# Altium schematic symbol library Hydra_Ref_sch.SCHLIB: 791 symbols (part 3 of 5) (continued)
## MRSS-12208 (continued)
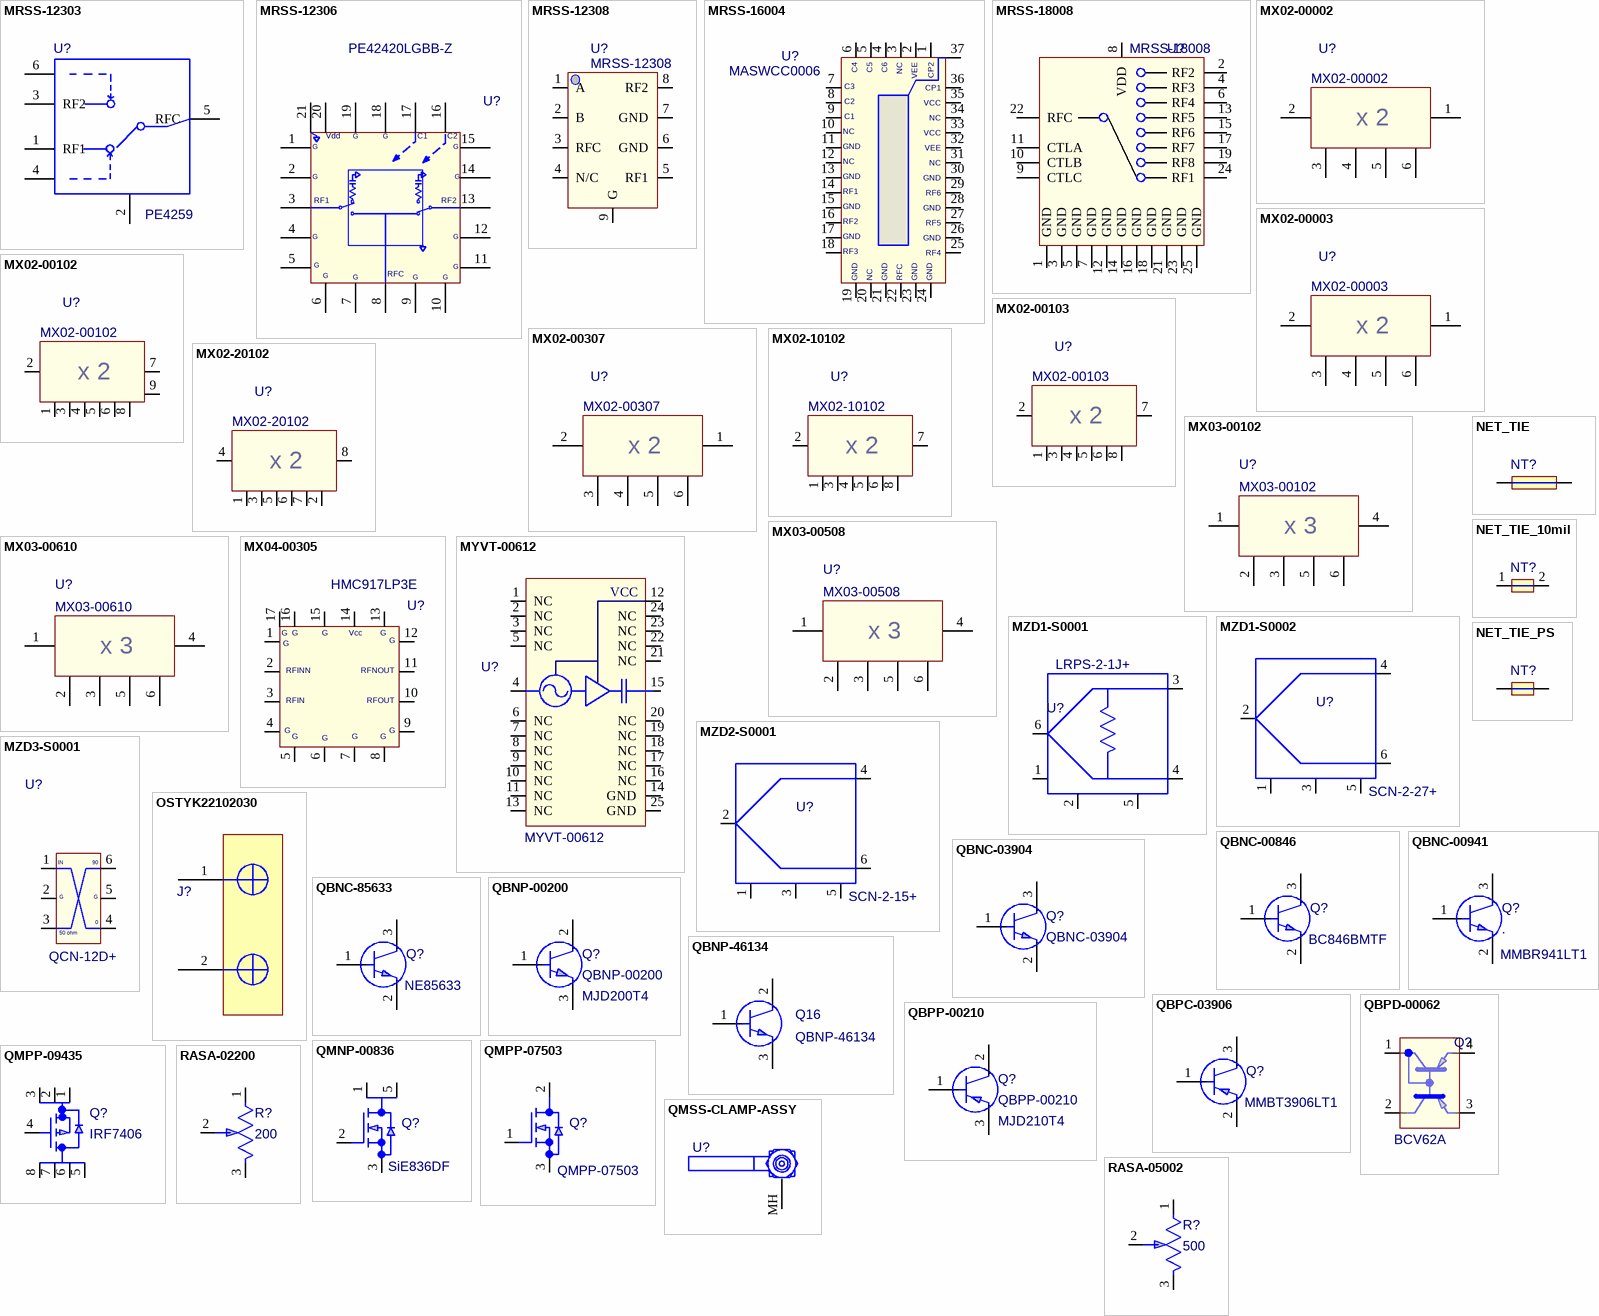
[diagram p11: symbols MRSS-12303 to RASA-05002]

## MRSS-12303
designator U?, comment M_PN: PE4259  (hidden comment: SWITCH;SPDT;3GHz;27DB ISO;50DBM;+BIAS;S8)
Value: PE4259; G_PN: MRSS-12303; NoLoad: .; Approved: CL; MFGR: PEREGRINE SEMICONDUCTOR; level: 1; ModifyDate: 3/19/12; item_number: MRSS-12303
footprint SO6-SC-70 (PACKAGE type SC-70)
pins: 1 RF1, 2 GND, 3 RF2, 4 CTRL, 5 RFC, 6 CTRL*_VDD

## MRSS-12306
designator U?, comment M_PN: PE42420LGBB-Z  (hidden comment: SSWITCH;SPDT;DC-6GHz;60DB ISO;30;4DBM;2.5-3.3V CTRL;QFN-20)
MFGR: PEREGRINE; Approved: CL; G_PN: MRSS-12306; Value: PE42420LGBB-Z; NoLoad: .; level: 1; ModifyDate: 9/24/14; item_number: MRSS-12306
footprint QFN-20_PEREGRINE (Footprint not found)
pins: 1 GND, 2 GND, 3 RF1, 4 GND, 5 GND, 6 GND, 7 GND, 8 NC, 9 GND, 10 GND, 11 GND, 12 GND, 13 RF2, 14 GND, 15 GND, 16 C2, 17 C1, 18 GND, 19 GND, 20 Vdd, 21 GND
text: G; RFC

## MRSS-12308
designator U?, comment G_PN: MRSS-12308  (hidden comment: SPDT SWITCH,DC-8.0 GHz,GaAs,IL .8 dB, SMT MSOP-8)
Value: HMC270MS8GE; MFGR: HITTITE; NoLoad: .; Approved: CL; level: 1; ModifyDate: 6/1/13; M_PN: HMC270MS8GE; item_number: MRSS-12308
footprint MS8GE (RoHS Mold Compound 192X118X43(mil))
pins: 1 A, 2 B, 3 RFC, 4 N/C, 5 RF1, 6 GND, 7 GND, 8 RF2, 9 G

## MRSS-16004
designator U?, comment M_PN: MASWCC0006  (hidden comment: SWITCH;SP6T;DC-4GHZ;25DB ISO;20NS;27DBM P1;PQFN-36)
MFGR: HITTITE; Approved: CL; G_PN: MRSS-16004; Value: MASWCC0006; NoLoad: .; level: 1; ModifyDate: 4/8/13; item_number: MRSS-16004
footprint QFN36_MACOM (CSP-2, LEAD-FREE 4 X 7 MM, 36-LEAD PQFN)
pins: 1 CP2, 2 VEE, 3 NC, 4 C6, 5 C5, 6 C4, 7 C3, 8 C2, 9 C1, 10 NC, 11 GND, 12 NC, 13 GND, 14 RF1, 15 GND, 16 RF2, 17 GND, 18 RF3, 19 GND, 20 NC, 21 GND, 22 RFC, 23 GND, 24 GND, 25 RF4, 26 GND, 27 RF5, 28 GND, 29 RF6, 30 GND, 31 NC, 32 VEE, 33 VCC, 34 NC, 35 VCC, 36 CP1, 37 GND

## MRSS-18008
designator U?, comment G_PN: MRSS-18008  (hidden comment: SWITCH;SP8T;8GHZ;POS CTRL;30DB ISO;19DBM;QFN-24)
MFGR: Hittite; NoLoad: .; Approved: NM; M_PN: HMC321LP4; level: 1; Value: *; ModifyDate: 11/14/12; item_number: MRSS-18008
footprint QFN50p400x400x100-25N
pins: 1 GND, 2 RF2, 3 GND, 4 RF3, 5 GND, 6 RF4, 7 GND, 8 VDD, 9 CTLC, 10 CTLB, 11 CTLA, 12 GND, 13 RF5, 14 GND, 15 RF6, 16 GND, 17 RF7, 18 GND, 19 RF8, 21 GND, 22 RFC, 23 GND, 24 RF1, 25 GND

## MX02-00002
designator U?, comment G_PN: MX02-00002  (hidden comment: DOUBLER;10-1000 MHZ IN;10.5DB CONV LOSS;12-16DBM IN;TTT167 CASE)
NoLoad: .; Approved: CL; MFGR: MINI-CIRCUITS; Value: SYK-2R+; level: 1; ModifyDate: 5/18/12; M_PN: SYK-2R+; item_number: MX02-00002
footprint SYK-2R (x2 Multiplier)
footprint SYK-2R 3-GND PINS (CASE STYLE TTT167)
pins: 1, 2, 3, 4, 5, 6
text: x 2

## MX02-00003
designator U?, comment G_PN: MX02-00003  (hidden comment: DOUBLER;100-3000 MHZ IN;11.5DB CONV LOSS;11-15DBM IN;TTT167 CASE)
NoLoad: .; Approved: CL; MFGR: MINI-CIRCUITS; Value: SYK-2-33+; level: 1; ModifyDate: 3/1/13; M_PN: SYK-2-33+; item_number: MX02-00003
footprint TTT167 (Footprint not found)
footprint SYK-2R 3-GND PINS (CASE STYLE TTT167)
pins: 1, 2, 3, 4, 5, 6
text: x 2

## MX02-00102
designator U?, comment G_PN: MX02-00102  (hidden comment: DOUBLER;700-2400 MHZ IN;15DB CONV LOSS;10-20DBM IN;SO-8)
NoLoad: .; Approved: CL; MFGR: HITTITE; Value: HMC156AC8; level: 1; ModifyDate: 3/11/13; M_PN: HMC156AC8; item_number: MX02-00102
footprint SO-8_Hittite (Hittite C8, 8 LEAD CERAMIC/METAL, Body 5.59x4.32mm, Pitch 1.27mm, Thermal Pad 4.83.2x3.81.2mm)
footprint SYK-2R 3-GND PINS (CASE STYLE TTT167)
pins: 1 NC, 2 IN, 3 G, 4 NC, 5 NC, 6 G, 7 OUT, 8 NC, 9 NC
text: x 2

## MX02-00103
designator U?, comment G_PN: MX02-00103  (hidden comment: DOUBLER;1250 3000 MHZ IN;15DB CONV LOSS;10-20DBM IN;MS8)
NoLoad: .; Approved: CL; MFGR: HITTITE; Value: HMC188MS8E; level: 1; ModifyDate: 3/11/13; M_PN: HMC188MS8E; item_number: MX02-00103
footprint MS8_Hittite (SOP, 8-Leads, Body 3.1x3.1mm, Pitch 0.65mm, IPC High Density)
footprint SYK-2R 3-GND PINS (CASE STYLE TTT167)
pins: 1 NC, 2 IN, 3 G, 4 NC, 5 NC, 6 G, 7 OUT, 8 NC
text: x 2

## MX02-00307
designator U?, comment G_PN: MX02-00307  (hidden comment: DOUBLER;3.4-7.2 GHZ IN;11DB CONV LOSS;8-13 DBM IN;DZ885 CASE)
NoLoad: .; Approved: CL; MFGR: MINI-CIRCUITS; Value: KC2-36+; level: 1; ModifyDate: 3/6/13; M_PN: KC2-36+; item_number: MX02-00307
footprint DZ885 (Footprint not found)
footprint SYK-2R 3-GND PINS (CASE STYLE TTT167)
pins: 1, 2, 3, 4, 5, 6
text: x 2

## MX02-10102
designator U?, comment G_PN: MX02-10102  (hidden comment: DOUBLER;850-2000 MHZ IN;15DB CONV LOSS;10-20DBM IN;SO-8)
NoLoad: .; Approved: CL; MFGR: HITTITE; Value: HMC187AMS8; level: 1; ModifyDate: 3/11/13; M_PN: HMC187AMS8; item_number: MX02-10102
footprint SO-8_Hittite (Footprint not found)
footprint SYK-2R 3-GND PINS (CASE STYLE TTT167)
pins: 1 NC, 2 IN, 3 G, 4 NC, 5 NC, 6 G, 7 OUT, 8 NC
text: x 2

## MX02-20102
designator U?, comment G_PN: MX02-20102  (hidden comment: DOUBLER;850-2000 MHZ IN;15DB CONV LOSS;10-20DBM IN;SO-8)
NoLoad: .; Approved: CL; MFGR: MINI-CIRCUITS; Value: KSX2-442+; level: 1; ModifyDate: 5/14/13; M_PN: KSX2-442+; item_number: MX02-20102
footprint HV1195 (OLD PART SIM-4432H+)
footprint SYK-2R 3-GND PINS (CASE STYLE TTT167)
pins: 1 GND, 2 TERM, 3 GND, 4 IN, 5 GND, 6 GND, 7 GND, 8 OUT
text: x 2

## MX03-00102
designator U?, comment G_PN: MX03-00102  (hidden comment: FFREQ MULTIPLIER X3;OUTPUT 1.2-2.1 GHz;12-17 dBm INPUT;SMT .25X.31X.16;CASE TT1224)
NoLoad: .; Approved: CL; MFGR: MINI-CIRCUITS; Value: RMK-3-212+; level: 1; ModifyDate: 8/2/16; M_PN: RMK-3-212+; item_number: MX03-00102
footprint TT1224 (.250x.160x.160" 6pin Frequency Multiplier - Mini-Circuit)
pins: 1, 2, 3, 4, 5, 6
text: x 3

## MX03-00508
designator U?, comment G_PN: MX03-00508  (hidden comment: FREQ MULTIPLIER X3;OUTPUT 5.4-8.1 GHz;0-6 dBm INPUT;  SMT .25X.31X.16;CASE TT1224)
NoLoad: .; Approved: NM; MFGR: MINI-CIRCUITS; Value: RMK-3-812+; level: 1; ModifyDate: 12/05/12; M_PN: RMK-3-812+; item_number: MX03-00508
footprint TT1224 (.250x.160x.160" 6pin Frequency Multiplier - Mini-Circuit)
pins: 1, 2, 3, 4, 5, 6
text: x 3

## MX03-00610
designator U?, comment G_PN: MX03-00610  (hidden comment: FREQ MULTIPLIER X3;OTPUT 6.6-10 GHz;13-17 dBm INPUT;SMT .25X.31X.16;CASE TT1224)
NoLoad: .; Approved: CL; MFGR: MINI-CIRCUITS; Value: RMK-3-14+; level: 1; ModifyDate: 3/12/13; M_PN: RMK-3-14+; item_number: MX03-00610
footprint TT1224 (.250x.160x.160" 6pin Frequency Multiplier - Mini-Circuit)
pins: 1, 2, 3, 4, 5, 6
text: x 3

## MX04-00305
designator U?, comment M_PN: HMC917LP3E  (hidden comment: QUADRUPLER;1500-2500 MHZ IN;5DB CONV LOSS;0-10DBM IN;LP3E)
MFGR: HITTITE; Approved: CL; G_PN: MX04-00305; Value: HMC917LP3E; NoLoad: .; level: 1; ModifyDate: 11.22/13; item_number: MX04-00305
footprint QFN-16_HITTITE_LP3 (QFN-16 HITTITE)
pins: 1 Vdd, 2 Vctl, 3 RFC, 4 NC, 5 EN, 6 NC, 7 NC, 8 NC, 9 RF1, 10 GND, 11 GND, 12 RF2, 13 NC, 14 NC, 15 NC, 16 NC, 17 GND
text: G; Vcc; RFINN; RFNOUT; RFIN; RFOUT

## MYVT-00612
designator U?, comment G_PN: MYVT-00612  (hidden comment: OSCILLATOR;VCO;MMIC;6-12GHz,+1dBm OUT;5V SUP;0-23V TUNE;4X4mm LC-24 W/BOT PAD)
MFGR: Hittite; NoLoad: .; Approved: NM; M_PN: HMC732LC4B; level: 1; Value: *; ModifyDate: 10/27/12; item_number: MYVT-00612
footprint QFN-24_HITTITE_LC4B_047 (LC4B – 4 x 4 mm QFN CERAMIC  HIGH FREQUENCY SMT PACKAGE, 47mil height)
pins: 1 NC, 2 NC, 3 NC, 4 GND, 5 NC, 6 NC, 7 NC, 8 NC, 9 NC, 10 NC, 11 NC, 12 VCC, 13 NC, 14 GND, 15 RFOUT, 16 NC, 17 NC, 18 NC, 19 NC, 20 NC, 21 NC, 22 NC, 23 NC, 24 NC, 25 GND

## MZD1-S0001
designator U?, comment LRPS-2-1J+
POWER DIVIDER;5-500MHZ;0DEG;.39X.31X.225; G_PN: MZD1-S0001; Approved: CL; NoLoad: .; MFGR: MINI-CIRCUITS; level: 1; Value: LRPS-2-1J+; ModifyDate: 02/22/12; M_PN: LRPS-2-1J+; item_number: MZD1-S0001
footprint SO6-QQQ569 (CASE STYLE QQQ569 -Mini-Circuit)
pins: 1, 2, 3, 4, 5, 6

## MZD1-S0002
designator U?, comment M_PN: SCN-2-27+  (hidden comment: LRPS-2-1J+)
POWER SPLITTER/COMBINER;2225-2700 MHZ;0 DEG;FV1206-1 CASE; Value: SCN-2-27+; Approved: CL; NoLoad: .; G_PN: MZD1-S0002; MFGR: MINI-CIRCUITS; level: 1; ModifyDate: 11/19/14; item_number: MZD1-S0002
footprint FV1206-1-PS (MINI-CIRCUITS FV1206-1 Power Splitter)
pins: 1 GND, 2, 3 GND, 4, 5 GND, 6

## MZD2-S0001
designator U?, comment M_PN: SCN-2-15+  (hidden comment: LRPS-2-1J+)
POWER SPLITTER/COMBINER;1100-1450 MHZ;0 DEG;FV1206-1 CASE; Value: SCN-2-15+; Approved: CL; NoLoad: .; G_PN: MZD2-S0001; MFGR: MINI-CIRCUITS; level: 1; ModifyDate: 02/22/12; item_number: MZD2-S0001
footprint FV1206-1-PS (MINI-CIRCUITS FV1206-1 Power Splitter)
pins: 1 GND, 2, 3 GND, 4, 5 GND, 6

## MZD3-S0001
designator U?, comment M_PN: QCN-12D+  (hidden comment: QCN-12D+ 800-1375 MHZ 90 DEGREE POWER SPLITTER/COMBINER, FV1206-1 SMT)
MFGR: MINI-CIRCUITS; NoLoad: .; Approved: CL; G_PN: MZD3-S0001; level: 1; ModifyDate: 3/31/16; Value: QCN-12D+; item_number: MZD3-S0001; line_number: 1
footprint FV1206-1-PS (MINI-CIRCUITS FV1206-1 Power Splitter)
pins: 1  , 2  , 3  , 4  , 5  , 6  
text: IN; 90; G; 0; 50 ohm

## NET_TIE
designator NT?, comment NET TIE, INNER LAYER 2  (value not drawn)  (net tie, no BOM)
Approved: CL; level: 1; NoLoad: N/L
footprint NET_TIE_IL2 (Footprint not found)
pins: 1, 2

## NET_TIE_10mil
designator NT?, comment NET TIE, 10 mil line  (value not drawn)  (net tie, no BOM)
Approved: CL; level: 1; NoLoad: N/L
footprint NET_TIE_10mil (Footprint not found)
pins: 1, 2

## NET_TIE_PS
designator NT?, comment NET TIE, DC-DC CONVERTERS  (value not drawn)  (net tie, no BOM)
Approved: CL; level: 1; NoLoad: N/L
footprint NET_TIE_PS - gnd
footprint NET_TIE_PS_gnd
pins: 1, 2, 3, 4, 5, 6, 7

## OSTYK22102030
designator J?, comment TERMINAL BLOCK, 2 TERMINALS, THRU-HOLE  (value not drawn)
M_PN: OSTYK22102030; MFGR: ON SHORE TECHNOLOGY INC; NoLoad: .; Approved: CL; level: 1; ModifyDate: 02/22/12
footprint ED2958-ND
pins: 1, 2

## QBNC-00846
designator Q?, comment M_PN: BC846BMTF  (hidden comment: 0.1A; 80V VCB0; 310mW; 200-450 HFE; 300MHz; SOT-23)
Value: BC846BMTF; G_PN: QBNC-00846; MFGR: FAIRCHILD; NoLoad: .; Approved: CL; level: 1; ModifyDate: 5/8/12; item_number: QBNC-00846
footprint SOT23-N (.95mm PITCH 1.3mmW 2.9mmL 1.1mmH)
pins: 1 BASE, 2 EMITTER, 3 COLLECTOR

## QBNC-00941
designator Q?, comment .  M_PN: MMBR941LT1
.05A;20V VCBO;.25W;50-200 HFE;8GHZ;SOT23; Value: MMBR941LT1; G_PN: QBNC-00941; MFGR: ON SEMI; Approved: CL; level: 1; NoLoad: .; ModifyDate: 4/20/12; item_number: QBNC-00941
footprint SOT23-N (.95mm PITCH 1.3mmW 2.9mmL 1.1mmH)
pins: 1 BASE, 2 EMITTER, 3 COLLECTOR

## QBNC-03904
designator Q?, comment G_PN: QBNC-03904  (hidden comment: MMBT3904LT1)
.2A IC;40V;.3W;100-300HFE;300MHZ;SOT-23; NoLoad: .; Approved: CL; MFGR: ON SEMI; level: 1; M_PN: MMBT3904LT1; Value: MMBT3904LT1; ModifyDate: 02/22/12; item_number: QBNC-03904
footprint SOT23-N (.95mm PITCH 1.3mmW 2.9mmL 1.1mmH)
pins: 1 BASE, 2 EMITTER, 3 COLLECTOR

## QBNC-85633
designator Q?, comment NE85633
0.1A; 20V VCB0; 500mW; 50-250 HFE; 6.5GHz; SOT-23; NoLoad: .; Approved: CL; G_PN: QBNC-85633; MFGR: RENESAS; level: 1; Value: NE85633; ModifyDate: 4/12/12; M_PN: NE85633; item_number: QBNC-85633
footprint SOT23-N (.95mm PITCH 1.3mmW 2.9mmL 1.1mmH)
pins: 1 BASE, 2 EMITTER, 3 COLLECTOR

## QBNP-00200
designator Q?, comment G_PN: QBNP-00200  M_PN: MJD200T4  (hidden comment: 5A;25V VCEO;12.5W;45 MIN HFE;DPAK)
Value: MJD200T4; NoLoad: .; Approved: CL; MFGR: ON SEMI; level: 1; ModifyDate: 02/22/12; item_number: QBNP-00200
footprint TO-252/DPAK_REVA (TO-252 Footprint)
footprint TO-252_DPAK_REVA
pins: 1 BASE, 2 COLLECTOR, 3 EMITTER

## QBNP-46134
designator Q16, comment G_PN: QBNP-46134  (hidden comment: .)
27.5 dBm @1GHz;5.5 GHz fT;15V MAX;250 mA MAX;SOT-89; Value: MMBR941LT1; MFGR: CEL; Approved: NM; M_PN: NE46134; level: 1; line_number: 635; NoLoad: .; ModifyDate: 11/28/12; item_number: QBNP-46134
footprint SOT89-3N (SOT89, 3-Leads, Body 4.5x2.5x1.6mm, Pitch 1.5mm)
pins: 1 BASE, 2 COLLECTOR, 3 EMITTER

## QBPC-03906
designator Q?, comment value MMBT3906LT1  (hidden comment: .2A IC;40V VCEO;.3W;100-300 HFE;250MHz)
MFGR: ON SEMI; NoLoad: .; Approved: CL; G_PN: QBPC-03906; level: 1; M_PN: MMBT3906LT1; ModifyDate: 4/3/12; item_number: QBPC-03906
footprint SOT23-N (.95mm PITCH 1.3mmW 2.9mmL 1.1mmH)
pins: 1 BASE, 2 EMITTER, 3 COLLECTOR

## QBPD-00062
designator Q?, comment M_PN: BCV62A  (hidden comment: DUAL .1A IC;30V VCEO;.25W;100-250 HFE;100 MHZ;SOT143B-4)
Value: QBPD-00062; MFGR: NXP; NoLoad: .; Approved: NM; level: 1; G_PN: QBPD-00062; ModifyDate: 8/28/12; item_number: QBPD-00062
footprint SOT143-N (1.9mm PITCH 1.3mmW 2.3mmL 1.1mmH -4pins)
pins: 1 BASE, 2 COLLECTOR, 3 EMITTER, 4 EMITTER

## QBPP-00210
designator Q?, comment G_PN: QBPP-00210  M_PN: MJD210T4  (hidden comment: 5A;25V VCEO;12.5W;PNP;DPAK)
Value: MJD210T4; NoLoad: .; Approved: CL; MFGR: ON SEMI; level: 1; ModifyDate: 02/22/12; item_number: QBPP-00210
footprint TO-252_DPAK_REVA
pins: 1 BASE, 2 COLLECTOR, 3 EMITTER

## QMNP-00836
designator Q?, comment M_PN: SiE836DF  (hidden comment: 200V;104W;18.3A;10V VGS ON ;.13 OHM RDS;POLARPAK SMT)
G_PN: QMNP-00836; NoLoad: .; Approved: NM; MFGR: VISHAY; level: 1; ModifyDate: 10/27/12; item_number: QMNP-00836
footprint MOS-SIE836DF (MOSFET)
pins: 1 S, 2 G, 3 D, 5 S

## QMPP-07503
designator Q?, comment G_PN: QMPP-07503  (hidden comment: 30V; 50A; 0.0075OHM;47W;N-CH POWER MOSFET;SMT;TO-252-3)
NoLoad: .; Approved: CL; MFGR: INFINEON; Value: IPD075N03L G; level: 1; ModifyDate: 5/6/13; M_PN: IPD075N03L G; item_number: QMPP-07503
footprint TO-252-3 INFINEON (Footprint not found)
footprint TO-252-3_INFINEON
pins: 1 G, 2 D, 3 S

## QMPP-09435
designator Q?, comment value IRF7406  (hidden comment: -30V;4A;.1OHM;2.5W;P CH MOSFET;SMT)
G_PN: QMPP-09435; NoLoad: .; Approved: CL; MFGR: INTERNATIONAL RECTIFIER; level: 1; M_PN: IRF7406; ModifyDate: 3/10/12; item_number: QMPP-09435
footprint SO8_MS-012 (JEDEC M-012)
pins: 1 S, 2 S, 3 S, 4 G, 5 D, 6 D, 7 D, 8 D

## QMSS-CLAMP-ASSY
designator U?  (value not drawn)  (no BOM)
connector retaining clip, KFH-440-12 stud, nut; NoLoad: N/L; level: 1; Approved: *; G_PN: *; MFGR: *; Value: *
footprint QMSS-CLAMP (connector retaining clip, KFHS-440-12 stud, nut)
pins: MH KFH-440-12 "KFH-440-12DT Broaching Stud, bottom side connected pad, 120 mil unplated clearance hole"

## RASA-02200
designator R?, comment value 200  (hidden comment: 220 OHM; 25%; 1T; SMT; 2.75MMx2.2MM; TOP ADJ)
M_PN: PVA2A221A01; G_PN: RASA-02200; NoLoad: .; MFGR: PANASONIC; Approved: CL; level: 1; ModifyDate: 2/6/14; item_number: RASA-02200
footprint TRIM-PVA2 (TRIMMER LOW PROFILE 2.2X2.75x0.81mm PANASONIC)
pins: 1, 2, 3

## RASA-05002
designator R?, comment value 500  (hidden comment: 500 OHM; 25%; 1T; SMT; 2mm; TOP ADJ)
NoLoad: .; G_PN: RASA-05002; M_PN: EVM-2NSX80B52; MFGR: PANASONIC; Approved: CL; level: 1; ModifyDate: 2/6/14; item_number: RASA-05002
footprint TRIM-EVM2N (TRIMMER LOW PROFILE 2.2X2.81x.81mm PANASONIC)
pins: 1, 2, 3

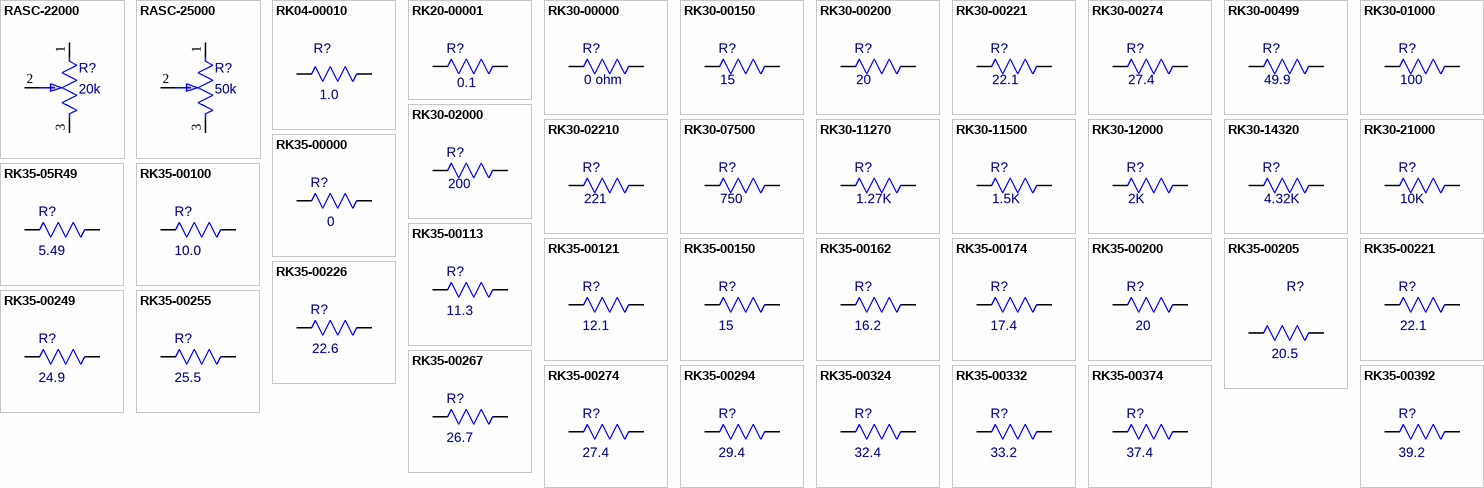
[diagram p12: symbols RASC-22000 to RK35-00392]

## RASC-22000
designator R?, comment value 20k  (hidden comment: 20K OHM;10%;11T;TOP ADJ;CERMET;J LEADS;3.5 X4.8MM SMT)
M_PN: SM-42TW503; G_PN: RASC-22000; NoLoad: .; MFGR: COPAL ELECTRONICS; Approved: CL; level: 1; ModifyDate: 9/21/12; item_number: RASC-22000
footprint TRIM-SM-42/43W (TRIMMER 3.9X4.8mm COPAL ELECTRONIC)
footprint TRIM-SM-42_43W
pins: 1, 2, 3

## RASC-25000
designator R?, comment value 50k  (hidden comment: 50K OHM;10%;11T;TOP ADJ;CERMET;J LEADS;3.5 X4.8MM SMT)
M_PN: SM-42TW503; G_PN: RASC-25000; NoLoad: .; MFGR: COPAL ELECTRONICS; Approved: CL; level: 1; ModifyDate: 4/11/12; item_number: RASC-25000
footprint TRIM-SM-42/43W (TRIMMER 3.9X4.8mm COPAL ELECTRONIC)
footprint TRIM-SM-42_43W
pins: 1, 2, 3

## RK04-00010
designator R?, comment value 1.0  (hidden comment: 1.0 OHMS;.1W;5%;500PPM;FILM CHIP;0805)
G_PN: RK04-00010; Approved: NM; NoLoad: .; MFGR: ANY; level: 1; ModifyDate: 11/07/12; M_PN: ANY; item_number: RK04-00010
footprint RES-0805-N
pins: 1, 2

## RK20-00001
designator R?, comment value 0.1  (hidden comment: .1 OHH;1%;100PPM;1W;FLAT CHIP;2010)
NoLoad: .; MFGR: Vishay; Approved: ZY; M_PN: WSL2010R1000FEA18; G_PN: RK20-00001; level: 1; ModifyDate: 05/04/12; item_number: RK20-00001
footprint RES-1210-N (METRIC 3225)
pins: 1, 2

## RK30-00000
designator R?, comment value 0 ohm  (hidden comment: RES;CHIP,0.05 ohms max;1A max;0201)
G_PN: RK30-00000; Approved: CL; NoLoad: .; MFGR: Vishay-Dale; M_PN: CRCW02010000Z0ED; level: 1; ModifyDate: 8/2/13; item_number: RK30-00000
footprint RES-0201-N (Footprint not found)
pins: 1, 2

## RK30-00150
designator R?, comment value 15  (hidden comment: 15 OHMS;.05W;1%;200PPM;FILM CHIP;0201)
G_PN: RK30-00150; Approved: CL; NoLoad: .; MFGR: Vishay-Dale; M_PN: CRCW020115R0FNED; level: 1; ModifyDate: 2/26/14; item_number: RK30-00150
footprint RES-0201-N (Footprint not found)
pins: 1, 2

## RK30-00200
designator R?, comment value 20  (hidden comment: 20 OHMS;.05W;1%;200PPM;FILM CHIP;0201)
G_PN: RK30-00200; Approved: CL; NoLoad: .; MFGR: Vishay-Dale; M_PN: CRCW020120R0FNED; level: 1; ModifyDate: 7/24/13; item_number: RK30-00200
footprint RES-0201-N (Footprint not found)
pins: 1, 2

## RK30-00221
designator R?, comment value 22.1  (hidden comment: 22.1 OHMS;.05W;1%;200PPM;FILM CHIP;0201)
G_PN: RK30-00221; Approved: CL; NoLoad: .; MFGR: Vishay-Dale; M_PN: CRCW020122R1FNED; level: 1; ModifyDate: 2/26/14; item_number: RK30-00221
footprint RES-0201-N (Footprint not found)
pins: 1, 2

## RK30-00274
designator R?, comment value 27.4  (hidden comment: 27.4 OHMS;.05W;1%;200PPM;FILM CHIP;0201)
G_PN: RK30-00274; Approved: CL; NoLoad: .; MFGR: KOA SPEER; M_PN: RK73H1HTTC27R4F; level: 1; ModifyDate: 6/27/14; item_number: RK30-00274
footprint RES-0201-N (Metric 1005)
pins: 1, 2

## RK30-00499
designator R?, comment value 49.9  (hidden comment: 49.9 OHMS;.05W;1%;200PPM;FILM CHIP;0201)
G_PN: RK30-00499; Approved: CL; NoLoad: .; MFGR: Vishay-Dale; M_PN: CRCW020149R9FNED; level: 1; ModifyDate: 2-11-14; item_number: RK30-00499
footprint RES-0201-N (Footprint not found)
pins: 1, 2

## RK30-01000
designator R?, comment value 100  (hidden comment: 100 OHMS;.05W;1%;100PPM;FILM CHIP;0201)
G_PN: RK30-01000; Approved: CL; NoLoad: .; MFGR: Vishay-Dala; M_PN: CRCW0201100RFKED; level: 1; ModifyDate: 7/23/13; item_number: RK30-01000
footprint RES-0201-N (Footprint not found)
pins: 1, 2

## RK30-02000
designator R?, comment value 200  (hidden comment: 200 OHMS;.05W;1%;100PPM;FILM CHIP;0201)
G_PN: RK30-02000; Approved: CL; NoLoad: .; MFGR: Vishay-Dale; M_PN: CRCW0201200RFKED; level: 1; ModifyDate: 7/25/13; item_number: RK30-02000
footprint RES-0201-N (Metric 1005)
pins: 1, 2

## RK30-02210
designator R?, comment value 221  (hidden comment: 221 OHMS;.05W;1%;100PPM;FILM CHIP;0201)
G_PN: RK30-02210; Approved: CL; NoLoad: .; MFGR: Vishay-Dale; M_PN: CRCW0201200RFKED; level: 1; ModifyDate: 2/26/14; item_number: RK30-02210
footprint RES-0201-N (Metric 1005)
pins: 1, 2

## RK30-07500
designator R?, comment value 750  (hidden comment: 750 OHMS;.05W;1%;100PPM;FILM CHIP;0201)
G_PN: RK30-07500; Approved: CL; NoLoad: .; MFGR: Vishay-Dale; M_PN: CRCW0201750RFKED; level: 1; ModifyDate: 7/25/13; item_number: RK30-07500
footprint RES-0201-N (Footprint not found)
pins: 1, 2

## RK30-11270
designator R?, comment value 1.27K  (hidden comment: 1.27 KOHMS;.05W;1%;100PPM;FILM CHIP;0201)
G_PN: RK30-11270; Approved: CL; NoLoad: .; MFGR: Vishay-Dale; M_PN: CRCW02011K27FKED; level: 1; ModifyDate: 7/30/13; item_number: RK30-11270
footprint RES-0201-N (Footprint not found)
pins: 1, 2

## RK30-11500
designator R?, comment value 1.5K  (hidden comment: 1.5 KOHMS;.05W;1%;100PPM;FILM CHIP;0201)
G_PN: RK30-11500; Approved: CL; NoLoad: .; MFGR: Vishay-Dale; M_PN: CRCW02011K50FKED; level: 1; ModifyDate: 7/29/13; item_number: RK30-11500
footprint RES-0201-N (Footprint not found)
pins: 1, 2

## RK30-12000
designator R?, comment value 2K  (hidden comment: 2 KOHMS;.05W;1%;100PPM;FILM CHIP;0201)
G_PN: RK30-12000; Approved: CL; NoLoad: .; MFGR: Vishay-Dale; M_PN: CRCW02012K00FKED; level: 1; ModifyDate: 7/31/13; item_number: RK30-12000
footprint RES-0201-N (Footprint not found)
pins: 1, 2

## RK30-14320
designator R?, comment value 4.32K  (hidden comment: 4.32 OHMS;.05W;1%;100PPM;FILM CHIP;0201)
G_PN: RK30-14320; Approved: CL; NoLoad: .; MFGR: Vishay-Dale; M_PN: CRCW02014K32FKED; level: 1; ModifyDate: 2/26/14; item_number: RK30-14320
footprint RES-0201-N (Footprint not found)
pins: 1, 2

## RK30-21000
designator R?, comment value 10K  (hidden comment: 10 KOHMS;.05W;1%;100PPM;FILM CHIP;0201)
G_PN: RK30-21000; Approved: CL; NoLoad: .; MFGR: Vishay-Dale; M_PN: CRCW020110K0FKED; level: 1; ModifyDate: 7/31/13; item_number: RK30-21000
footprint RES-0201-N (Footprint not found)
pins: 1, 2

## RK35-00000
designator R?, comment value 0  (hidden comment: JUMPER;0 OHMS;SMT;0402)
G_PN: RK35-00000; Approved: CL; NoLoad: .; MFGR: ANY; level: 1; ModifyDate: 02/22/12; M_PN: ANY; item_number: RK35-00000
footprint RES-0402-N (0402 Footprint)
pins: 1, 2

## RK35-05R49
designator R?, comment value 5.49  (hidden comment: 5.49 OHMS;.06W;1%;200PPM;FILM;CHIP;0402)
G_PN: RK35-05R49; NoLoad: .; Approved: CL; M_PN: ANY; level: 1; ModifyDate: 02/22/12; MFGR: ANY; item_number: RK35-05R49
footprint RES-0402-N (0402 Footprint)
pins: 1, 2

## RK35-00100
designator R?, comment value 10.0  (hidden comment: 10 OHMS;.06W;1%;200PPM;FILM;CHIP;0402)
G_PN: RK35-00100; Approved: CL; NoLoad: .; MFGR: ANY; level: 1; ModifyDate: 02/22/12; M_PN: ANY; item_number: RK35-00100
footprint RES-0402-N (0402 Footprint)
pins: 1, 2

## RK35-00113
designator R?, comment value 11.3  (hidden comment: 11.3 OHMS;.06W;1%;200PPM;FILM;CHIP;0402)
G_PN: RK35-00113; NoLoad: .; MFGR: ANY; Approved: CL; level: 1; ModifyDate: 02/22/12; M_PN: ANY; item_number: RK35-00113
footprint RES-0402-N (0402 Footprint)
pins: 1, 2

## RK35-00121
designator R?, comment value 12.1  (hidden comment: 12.1 OHMS;.06W;1%;200PPM;FILM;CHIP;0402)
G_PN: RK35-00121; Approved: CL; NoLoad: .; MFGR: ANY; level: 1; ModifyDate: 02/22/12; M_PN: ANY; item_number: RK35-00121
footprint RES-0402-N (0402 Footprint)
pins: 1, 2

## RK35-00150
designator R?, comment value 15  (hidden comment: 15 OHMS;.06W;1%;200PPM;FILM;CHIP;0402)
G_PN: RK35-00150; Approved: CL; NoLoad: .; M_PN: ANY; level: 1; ModifyDate: 02/22/13; MFGR: ANY; item_number: RK35-00150
footprint RES-0402-N (0402 Footprint)
pins: 1, 2

## RK35-00162
designator R?, comment value 16.2  (hidden comment: 16.2 OHMS;.06W;1%;200PPM;FILM;CHIP;0402)
G_PN: RK35-00162; Approved: CL; NoLoad: .; M_PN: ANY; level: 1; ModifyDate: 02/28/13; MFGR: ANY; item_number: RK35-00162
footprint RES-0402-N (0402 Footprint)
pins: 1, 2

## RK35-00174
designator R?, comment value 17.4  (hidden comment: 17.4 OHMS;.06W;1%;200PPM;FILM;CHIP;0402)
G_PN: RK35-00174; Approved: CL; NoLoad: .; M_PN: ANY; level: 1; ModifyDate: 02/22/12; MFGR: ANY; item_number: RK35-00174
footprint RES-0402-N (0402 Footprint)
pins: 1, 2

## RK35-00200
designator R?, comment value 20  (hidden comment: 20 OHMS;.06W;1%;200PPM;FILM;CHIP;0402)
G_PN: RK35-00200; Approved: CL; NoLoad: .; MFGR: ANY; level: 1; ModifyDate: 02/22/12; M_PN: ANY; item_number: RK35-00200
footprint RES-0402-N (0402 Footprint)
pins: 1, 2

## RK35-00205
designator R?, comment value 20.5  (hidden comment: 20.5 OHMS;.06W;1%;200PPM;FILM;CHIP;0402)
Approved: CL; G_PN: RK35-00205; MFGR: ANY; NoLoad: .; level: 1; ModifyDate: 02/22/12; M_PN: ANY; item_number: RK35-00205
footprint RES-0402-N (0402 Footprint)
pins: 1, 2

## RK35-00221
designator R?, comment value 22.1  (hidden comment: 22.1 OHMS;.06W;1%;200PPM;FILM;CHIP;0402)
G_PN: RK35-00221; NoLoad: .; Approved: CL; MFGR: ANY; level: 1; ModifyDate: 5/6/13; M_PN: ANY; item_number: RK35-00221
footprint RES-0402-N (0402 Footprint)
pins: 1, 2

## RK35-00226
designator R?, comment value 22.6  (hidden comment: 22.6 OHMS;.06W;1%;200PPM;FILM;CHIP;0402)
G_PN: RK35-00226; NoLoad: .; Approved: CL; MFGR: ANY; level: 1; ModifyDate: 02/22/12; M_PN: ANY; item_number: RK35-00226
footprint RES-0402-N (0402 Footprint)
pins: 1, 2

## RK35-00249
designator R?, comment value 24.9  (hidden comment: 24.9 OHMS;.06W;1%;200PPM;FILM;CHIP;0402)
G_PN: RK35-00249; NoLoad: .; Approved: CL; MFGR: ANY; level: 1; ModifyDate: 02/22/12; M_PN: ANY; item_number: RK35-00249
footprint RES-0402-N (0402 Footprint)
pins: 1, 2

## RK35-00255
designator R?, comment value 25.5  (hidden comment: 25.5 OHMS;.06W;1%;200PPM;FILM;CHIP;0402)
G_PN: RK35-00255; NoLoad: .; Approved: CL; MFGR: ANY; level: 1; ModifyDate: 5/14/12; M_PN: ANY; item_number: RK35-00255
footprint RES-0402-N (0402 Footprint)
pins: 1, 2

## RK35-00267
designator R?, comment value 26.7  (hidden comment: 26.7 OHMS;.06W;1%;100PPM;FILM;CHIP;0402)
G_PN: RK35-00267; NoLoad: .; Approved: CL; MFGR: ANY; level: 1; ModifyDate: 5/13/13; M_PN: ANY; item_number: RK35-00267
footprint RES-0402-N (0402 Footprint)
pins: 1, 2

## RK35-00274
designator R?, comment value 27.4  (hidden comment: 27.4 OHMS;.06W;1%;200PPM;FILM;CHIP;0402)
G_PN: RK35-00274; NoLoad: .; Approved: CL; MFGR: ANY; level: 1; ModifyDate: 2/22/13; M_PN: ANY; item_number: RK35-00274
footprint RES-0402-N (0402 Footprint)
pins: 1, 2

## RK35-00294
designator R?, comment value 29.4  (hidden comment: 29.4 OHMS;.06W;1%;200PPM;FILM;CHIP;0402)
G_PN: RK35-00294; NoLoad: .; Approved: CL; MFGR: ANY; level: 1; ModifyDate: 2/26/13; M_PN: ANY; item_number: RK35-00294
footprint RES-0402-N (0402 Footprint)
pins: 1, 2

## RK35-00324
designator R?, comment value 32.4  (hidden comment: 32.4 OHMS;.06W;1%;200PPM;FILM;CHIP;0402)
G_PN: RK35-00324; NoLoad: .; Approved: CL; MFGR: ANY; level: 1; ModifyDate: 02/22/12; M_PN: ANY; item_number: RK35-00324
footprint RES-0402-N (0402 Footprint)
pins: 1, 2

## RK35-00332
designator R?, comment value 33.2  (hidden comment: 33.2 OHMS;.06W;1%;200PPM;FILM;CHIP;0402)
G_PN: RK35-00332; NoLoad: .; Approved: CL; MFGR: ANY; level: 1; ModifyDate: 02/22/12; M_PN: ANY; item_number: RK35-00332
footprint RES-0402-N (0402 Footprint)
pins: 1, 2

## RK35-00374
designator R?, comment value 37.4  (hidden comment: 37.4 OHMS;.06W;1%;200PPM;FILM;CHIP;0402)
G_PN: RK35-00374; NoLoad: .; Approved: CL; MFGR: ANY; level: 1; ModifyDate: 2/14/13; M_PN: ANY; item_number: RK35-00374
footprint RES-0402-N (0402 Footprint)
pins: 1, 2

## RK35-00392
designator R?, comment value 39.2  (hidden comment: 39.2 OHMS;.06W;1%;200PPM;FILM;CHIP;0402)
G_PN: RK35-00392; NoLoad: .; Approved: CL; MFGR: ANY; level: 1; ModifyDate: 4/11/12; M_PN: ANY; item_number: RK35-00392
footprint RES-0402-N (0402 Footprint)
pins: 1, 2

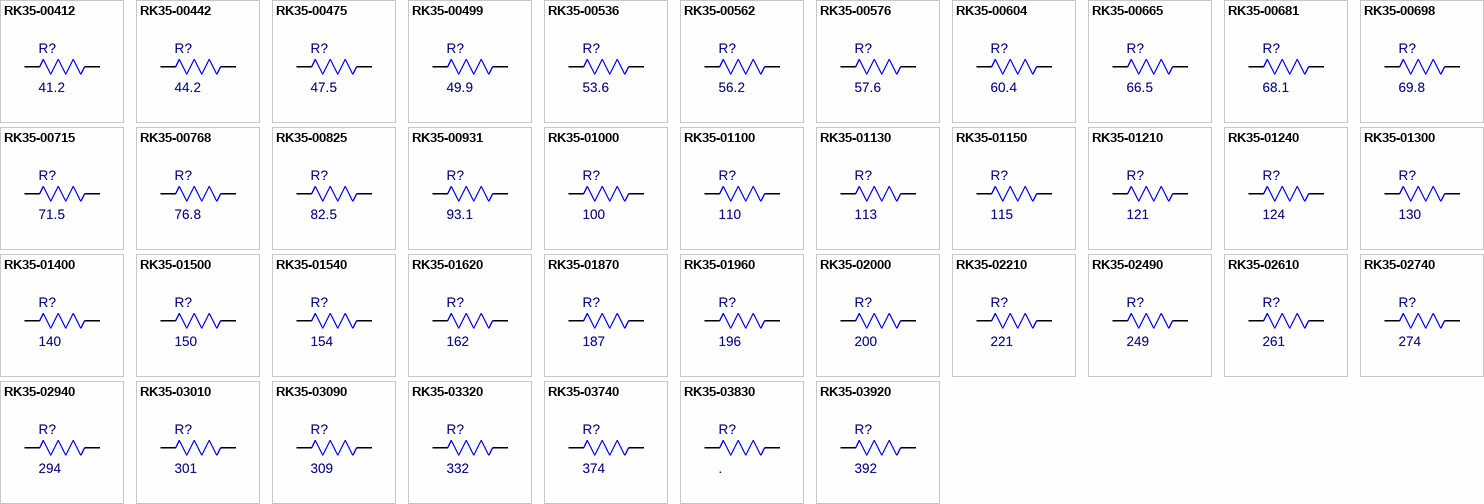
[diagram p13: symbols RK35-00412 to RK35-03920]

## RK35-00412
designator R?, comment value 41.2  (hidden comment: 41.2 OHMS;.06W;1%;200PPM;FILM;CHIP;0402)
G_PN: RK35-00412; NoLoad: .; Approved: CL; MFGR: ANY; level: 1; ModifyDate: 4/9/12; M_PN: ANY; item_number: RK35-00412
footprint RES-0402-N (0402 Footprint)
pins: 1, 2

## RK35-00442
designator R?, comment value 44.2  (hidden comment: 44.2 OHMS;.06W;1%;200PPM;FILM;CHIP;0402)
G_PN: RK35-00442; NoLoad: .; Approved: CL; MFGR: ANY; level: 1; ModifyDate: 3/1/13; M_PN: ANY; item_number: RK35-00442
footprint RES-0402-N (0402 Footprint)
pins: 1, 2

## RK35-00475
designator R?, comment value 47.5  (hidden comment: 47.5 OHMS;.06W;1%;200PPM;FILM;CHIP;0402)
G_PN: RK35-00475; NoLoad: .; Approved: CL; MFGR: ANY; level: 1; ModifyDate: 4/9/12; M_PN: ANY; item_number: RK35-00475
footprint RES-0402-N (0402 Footprint)
pins: 1, 2

## RK35-00499
designator R?, comment value 49.9  (hidden comment: 49.9 OHMS;.06W;1%;200PPM;FILM;CHIP;0402)
Approved: CL; G_PN: RK35-00499; NoLoad: .; MFGR: ANY; level: 1; ModifyDate: 02/22/12; M_PN: ANY; item_number: RK35-00499
footprint RES-0402-N (0402 Footprint)
pins: 1, 2

## RK35-00536
designator R?, comment value 53.6  (hidden comment: 53.6 OHMS;.06W;1%;200PPM;FILM;CHIP;0402)
G_PN: RK35-00536; Approved: CL; NoLoad: .; M_PN: ANY; level: 1; ModifyDate: 02/22/12; MFGR: ANY; item_number: RK35-00536
footprint RES-0402-N (0402 Footprint)
pins: 1, 2

## RK35-00562
designator R?, comment value 56.2  (hidden comment: 56.2 OHMS;.06W;1%;200PPM;FILM;CHIP;0402)
G_PN: RK35-00562; Approved: CL; NoLoad: .; MFGR: ANY; level: 1; ModifyDate: 4/23/13; M_PN: ANY; item_number: RK35-00562
footprint RES-0402-N (0402 Footprint)
pins: 1, 2

## RK35-00576
designator R?, comment value 57.6  (hidden comment: 57.6 OHMS;.06W;1%;200PPM;FILM;CHIP;0402)
G_PN: RK35-00576; Approved: CL; NoLoad: .; MFGR: ANY; level: 1; ModifyDate: 02/22/12; M_PN: ANY; item_number: RK35-00576
footprint RES-0402-N (0402 Footprint)
pins: 1, 2

## RK35-00604
designator R?, comment value 60.4  (hidden comment: 60.4 Ohms;.06W;1%;±100PPM;CHIP RES;0402)
G_PN: RK35-00604; Approved: CL; NoLoad: .; MFGR: ANY; level: 1; ModifyDate: 5//8/13; M_PN: ANY; item_number: RK35-00604
footprint RES-0402-N (0402 Footprint)
pins: 1, 2

## RK35-00665
designator R?, comment value 66.5  (hidden comment: 66.5 OHMS;.06W;1%;200PPM;FILM;CHIP;0402)
G_PN: RK35-00665; Approved: CL; NoLoad: .; MFGR: ANY; level: 1; ModifyDate: 10/06/12; M_PN: ANY; item_number: RK35-00665
footprint RES-0402-N (0402 Footprint)
pins: 1, 2

## RK35-00681
designator R?, comment value 68.1  (hidden comment: 68.1 OHMS;.06W;1%;200PPM;FILM;CHIP;0402)
G_PN: RK35-00681; Approved: CL; NoLoad: .; MFGR: ANY; level: 1; ModifyDate: 3/26/13; M_PN: ANY; item_number: RK35-00681
footprint RES-0402-N (0402 Footprint)
pins: 1, 2

## RK35-00698
designator R?, comment value 69.8  (hidden comment: 69.8 OHMS;.06W;1%;200PPM;FILM;CHIP;0402)
G_PN: RK35-00698; Approved: CL; NoLoad: .; MFGR: ANY; level: 1; ModifyDate: 3/6/13; M_PN: ANY; item_number: RK35-00698
footprint RES-0402-N (0402 Footprint)
pins: 1, 2

## RK35-00715
designator R?, comment value 71.5  (hidden comment: 71.5 OHMS;.06W;1%;200PPM;FILM;CHIP;0402)
G_PN: RK35-00715; Approved: CL; NoLoad: .; MFGR: ANY; level: 1; ModifyDate: 4/26/13; M_PN: ANY; item_number: RK35-00715
footprint RES-0402-N (0402 Footprint)
pins: 1, 2

## RK35-00768
designator R?, comment value 76.8  (hidden comment: 76.8 OHMS;.06W;1%;200PPM;FILM;CHIP;0402)
G_PN: RK35-00768; Approved: CL; NoLoad: .; MFGR: ANY; level: 1; ModifyDate: 2/28/113; M_PN: ANY; item_number: RK35-00768
footprint RES-0402-N (0402 Footprint)
pins: 1, 2

## RK35-00825
designator R?, comment value 82.5  (hidden comment: 82.5 OHMS;.06W;1%;200PPM;FILM;CHIP;0402)
G_PN: RK35-00825; Approved: CL; NoLoad: .; MFGR: ANY; level: 1; ModifyDate: 4/25/13; M_PN: ANY; item_number: RK35-00825
footprint RES-0402-N (0402 Footprint)
pins: 1, 2

## RK35-00931
designator R?, comment value 93.1  (hidden comment: 93.1 OHMS;.06W;1%;200PPM;FILM;CHIP;0402)
G_PN: RK35-00931; Approved: CL; NoLoad: .; MFGR: ANY; level: 1; ModifyDate: 12/20/13; M_PN: ANY; item_number: RK35-00931
footprint RES-0402-N (0402 Footprint)
pins: 1, 2

## RK35-01000
designator R?, comment value 100  (hidden comment: 100 OHMS; 1%; .1W; 100PPM; FILM; CHIP; 0402)
G_PN: RK35-01000; Approved: CL; NoLoad: .; MFGR: ANY; level: 1; ModifyDate: 02/22/12; M_PN: ANY; item_number: RK35-01000
footprint RES-0402-N (0402 Footprint)
pins: 1, 2

## RK35-01100
designator R?, comment value 110  (hidden comment: 110 OHMS; 1%; .1W; 100PPM; FILM; CHIP; 0402)
Approved: CL; G_PN: RK35-01100; NoLoad: .; MFGR: ANY; level: 1; ModifyDate: 02/22/12; M_PN: ANY; item_number: RK35-01100
footprint RES-0402-N (0402 Footprint)
pins: 1, 2

## RK35-01130
designator R?, comment value 113  (hidden comment: 113 OHMS; 1%; .1W; 100PPM; FILM; CHIP; 0402)
NoLoad: .; G_PN: RK35-01130; MFGR: ANY; Approved: CL; level: 1; ModifyDate: 02/28/13; M_PN: ANY; item_number: RK35-01130
footprint RES-0402-N (0402 Footprint)
pins: 1, 2

## RK35-01150
designator R?, comment value 115  (hidden comment: 115 OHMS; 1%; .1W; 100PPM; FILM; CHIP; 0402)
NoLoad: .; G_PN: RK35-01150; MFGR: ANY; Approved: CL; level: 1; ModifyDate: 02/22/12; M_PN: ANY; item_number: RK35-01150
footprint RES-0402-N (0402 Footprint)
pins: 1, 2

## RK35-01210
designator R?, comment value 121  (hidden comment: 121 OHMS; 1%; .1W; 100PPM; FILM; CHIP; 0402)
G_PN: RK35-01210; NoLoad: .; MFGR: ANY; Approved: CL; level: 1; ModifyDate: 02/22/12; M_PN: ANY; item_number: RK35-01210
footprint RES-0402-N (0402 Footprint)
pins: 1, 2

## RK35-01240
designator R?, comment value 124  (hidden comment: 124 OHMS; 1%; .1W; 100PPM; FILM; CHIP; 0402)
G_PN: RK35-01240; NoLoad: .; MFGR: ANY; Approved: CL; level: 1; ModifyDate: 4/23/13; M_PN: ANY; item_number: RK35-01240
footprint RES-0402-N (0402 Footprint)
pins: 1, 2

## RK35-01300
designator R?, comment value 130  (hidden comment: 130 OHMS; 1%; .1W; 100PPM; FILM; CHIP; 0402)
NoLoad: .; MFGR: ANY; Approved: CL; G_PN: RK35-01300; level: 1; ModifyDate: 3/1/13; M_PN: ANY; item_number: RK35-01300
footprint RES-0402-N (0402 Footprint)
pins: 1, 2

## RK35-01400
designator R?, comment value 140  (hidden comment: 140 OHMS; 1%; .1W; 100PPM; FILM; CHIP; 0402)
NoLoad: .; MFGR: ANY; Approved: CL; G_PN: RK35-01400; level: 1; ModifyDate: 4/11/12; M_PN: ANY; item_number: RK35-01400
footprint RES-0402-N (0402 Footprint)
pins: 1, 2

## RK35-01500
designator R?, comment value 150  (hidden comment: 150 OHMS; 1%; .1W; 100PPM; FILM; CHIP; 0402)
G_PN: RK35-01500; NoLoad: .; Approved: CL; MFGR: ANY; level: 1; ModifyDate: 02/22/12; M_PN: ANY; item_number: RK35-01500
footprint RES-0402-N (0402 Footprint)
pins: 1, 2

## RK35-01540
designator R?, comment value 154  (hidden comment: 154 OHMS; 1%; .1W; 100PPM; FILM; CHIP; 0402)
G_PN: RK35-01540; NoLoad: .; Approved: CL; MFGR: ANY; level: 1; ModifyDate: 8/2/13; M_PN: ANY; item_number: RK35-01540
footprint RES-0402-N (0402 Footprint)
pins: 1, 2

## RK35-01620
designator R?, comment value 162  (hidden comment: 162 OHMS; 1%; .1W; 100PPM; FILM; CHIP; 0402)
G_PN: RK35-01620; NoLoad: .; Approved: CL; MFGR: ANY; level: 1; ModifyDate: 12/20/13; M_PN: ANY; item_number: RK35-01620
footprint RES-0402-N (0402 Footprint)
pins: 1, 2

## RK35-01870
designator R?, comment value 187  (hidden comment: 187 OHMS; 1%; .1W; 100PPM; FILM; CHIP; 0402)
G_PN: RK35-01870; NoLoad: .; MFGR: ANY; Approved: CL; level: 1; ModifyDate: 02/22/12; M_PN: ANY; item_number: RK35-01870
footprint RES-0402-N (0402 Footprint)
pins: 1, 2

## RK35-01960
designator R?, comment value 196  (hidden comment: 196 OHMS; 1%; .1W; 100PPM; FILM; CHIP; 0402)
G_PN: RK35-01960; NoLoad: .; MFGR: ANY; Approved: CL; level: 1; ModifyDate: 02/13/13; M_PN: ANY; item_number: RK35-01960
footprint RES-0402-N (0402 Footprint)
pins: 1, 2

## RK35-02000
designator R?, comment value 200  (hidden comment: 200 OHMS; 1%; .1W; 100PPM; FILM; CHIP; 0402)
G_PN: RK35-02000; Approved: CL; NoLoad: .; MFGR: ANY; level: 1; ModifyDate: 02/22/12; M_PN: ANY; item_number: RK35-02000
footprint RES-0402-N (0402 Footprint)
pins: 1, 2